# Altium footprint library DC-DC.PcbLib: 5 footprints
Each footprint in its own frame and in the unit in brackets; x right, y up, seen from the top. Pads: shape width x height; smd on the part's side, far side on the other; paste and mask are expansions set on the pad; w line width, h text height; cw(c..) or ccw(c..) is an arc to the next point about the centre after c.
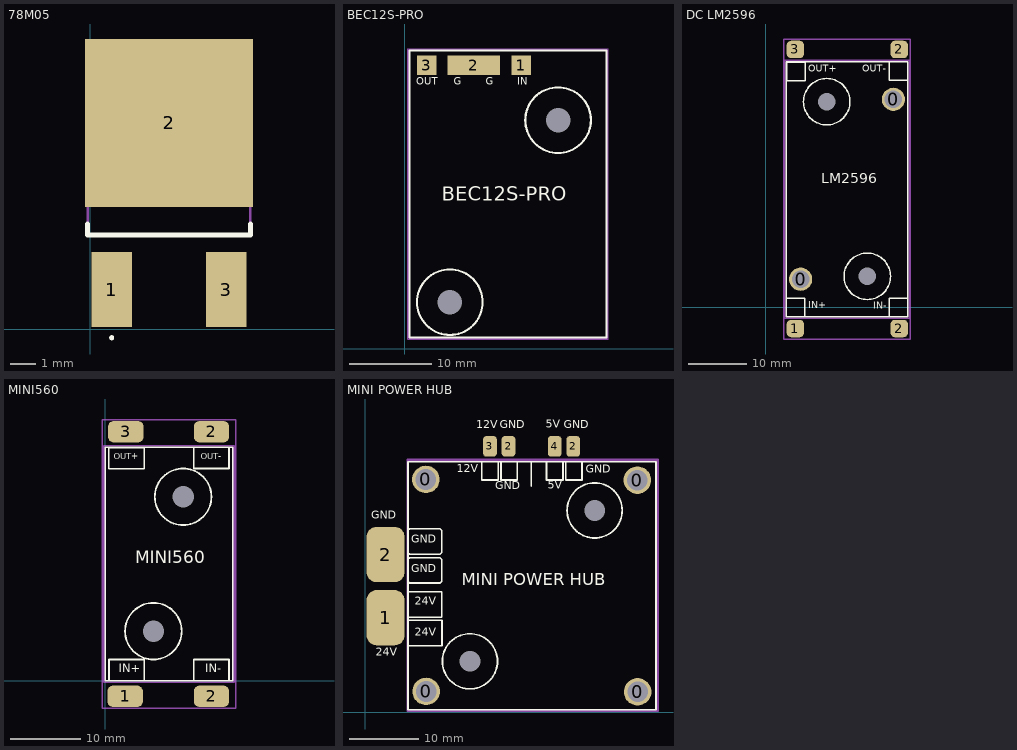
[diagram p0: the footprints below, top view; thin cyan lines are the x and y axes]

## 78M05 [mm]
pads (3):
  rect 1.6x3 smd: 1(0.86,1.579) 3(5.432,1.579)
  rect 6.7x6.7 smd: 2(3.146,8.229)
Top Overlay:
  lines w0.1: 0.86,-0.396 cw(c0.86,-0.346) 0.86,-0.296 cw(c0.86,-0.346) 0.86,-0.396
  lines w0.2: -0.104,4.204 -0.104,3.754 6.396,3.754 6.396,4.204
Mechanical 15:
  lines w0.1: -0.104,3.754 6.396,3.754 6.396,9.854 -0.104,9.854 -0.104,3.754
3D body "L78M05CDT.stp": height 2.39, standoff -0.13, extent -0.165,0.46 6.565,10.8

## BEC12S-PRO [mm]
pads (5):
  round 0 hole 3 unplated: 0(5.5,5.7) 0(18.707,27.9)
  rect 2.4x2.4 / inner rect 2.4x2.4 / far side rect 0x0 all layers, no hole: 1(14.2,34.6) 3(2.7,34.6)
  rect 6.4x2.4 / inner rect 2.4x2.4 / far side rect 0x0 all layers, no hole: 2(8.4,34.6)
Top Overlay:
  circle w0.254: c18.707,27.9 r4
  circle w0.254: c5.507,5.7 r4
  lines w0.254: 0.6,1.4 24.6,1.4 24.6,36.4 0.6,36.4 0.6,1.4
  text "OUT" at 1.4,31.917 h1.5
  text "IN" at 13.7,31.9 h1.5
  text "G" at 9.9,31.917 h1.5
  text "G" at 6,31.917 h1.5
  text "BEC12S-PRO" at 4.5,17.435 h3
Top Solder:
  region: 3.9,35.8 1.5,35.8 1.5,33.4 3.9,33.4
Mechanical 1:
  lines w0.1: 0.5,1.3 24.7,1.3 24.7,36.5 0.5,36.5 0.5,1.3
Top Courtyard:
  lines w0.1: 0.4,1.2 24.8,1.2 24.8,36.6 0.4,36.6 0.4,1.2
3D body "BEC12S-PRO.step": height 6.5, standoff -4.7, extent -0.1,-0.013 25.4,36.613

## DC LM2596 [mm]
pads (8):
  round 4 hole 3 mask+0.1: 0(6,4.8)
  round 0 hole 3 unplated: 0(10.5,35.4) 0(17.5,5.3)
  round 4 hole 3: 0(22,35.8)
  rrect50% 3x3 / inner rect 0x0 / far side rrect50% 0x0 all layers, no hole: 1(5.1,-3.7) 2(23,-3.7) 2(23,44.4) 3(5.1,44.4)
Top Overlay:
  circle w0.254: c10.5,35.4 r4
  circle w0.254: c17.5,5.3 r4
  lines w0.254: 3.5,-1.7 6.7,-1.7 6.7,1.5 3.5,1.5 3.5,-1.7 ; 3.5,-1.7 24.5,-1.7 ; 3.5,-1.7 3.5,42.3 24.5,42.3 ; 24.5,-1.7 21.3,-1.7 21.3,1.5 24.5,1.5 24.5,-1.7 ; 24.5,-1.7 24.5,42.3 ; 24.5,42.3 21.3,42.3 21.3,39.1 24.5,39.1 24.5,42.3 ; 3.6,39 6.8,39 6.8,42.2 3.6,42.2 3.6,39
  text "LM2596" at 9.6,20.735 h3
  text "IN+" at 7.3,-0.6 h2
  text "IN-" at 18.5,-0.7 h2
  text "OUT+" at 7.3,40.123 h2
  text "OUT-" at 16.6,40.123 h2
Mechanical 1:
  lines w0.254: 3.3,-1.9 24.7,-1.9 24.7,42.5 3.3,42.5 3.3,-1.9
Top Courtyard:
  lines w0.254: 3.1,-5.5 24.9,-5.5 24.9,46.2 3.1,46.2 3.1,-5.5
3D body "LM2596S.step": height 13.5, standoff 1, extent 3.5,-1.7 24.5,42.3

## MINI560 [mm]
pads (6):
  round 0 hole 3 unplated: 0(6.798,7.006) 0(11,26)
  rrect50% 5x3 / inner rect 0x0 / far side rrect50% 0x0 all layers, no hole: 1(2.8,-2.2) 2(15,-2.2) 2(15,35.2) 3(2.9,35.2)
Top Overlay:
  circle w0.254: c6.798,7.006 r4
  circle w0.254: c11,26 r4
  lines w0.254: 0,0 18,0 18,33 0,33 0,0 ; 0.498,29.951 5.498,29.951 5.498,32.951 0.498,32.951 0.498,29.951 ; 0.5,0 5.5,0 5.5,3 0.5,3 0.5,0 ; 12.5,0 17.5,0 17.5,3 12.5,3 12.5,0 ; 12.5,30 12.5,33 17.5,33 17.5,30 12.5,30
  text "MINI560" at 4.2,15.935 h3
  text "OUT-" at 13.5,30.917 h1.5
  text "OUT+" at 1.2,30.917 h1.5
  text "IN-" at 14.1,0.8 h2
  text "IN+" at 1.9,0.8 h2
Mechanical 1:
  lines w0.254: -0.2,-0.2 18.2,-0.2 18.2,33.2 -0.2,33.2 -0.2,-0.2
Top Courtyard:
  lines w0.2: -0.4,-3.9 18.4,-3.9 18.4,36.9 -0.4,36.9 -0.4,-3.9
3D body "MINI560.step": height 3, standoff -0.15, extent -0.316,-0.392 18.316,33.2

## MINI POWER HUB [mm]
pads (12):
  round 4 hole 3 mask+0.1: 0(8.8,33.8)
  round 4 hole 3: 0(8.85,3.025) 0(39.5,33.7) 0(39.55,2.975)
  round 0 hole 3 unplated: 0(15.2,7.4) 0(33.3,29.3)
  rrect50% 5.5x8 / inner rect 0x0 / far side rrect50% 0x0 all layers, no hole: 1(2.95,13.725) 2(2.95,22.9)
  rrect50% 2x3 / inner rect 0x0 / far side rrect50% 0x0 all layers, no hole: 2(20.8,38.6) 2(30.2,38.6) 3(18.1,38.6) 4(27.5,38.6)
Top Overlay:
  circle w0.254: c33.3,29.3 r4
  circle w0.254: c15.2,7.4 r4
  lines w0.254: 24.1,32.823 24.1,36.3 ; 6.205,13.787 6.205,17.487 11.105,17.487 11.105,13.787 6.205,13.787 ; 6.205,19.004 6.459,18.75 10.846,18.75 11.1,19.004 11.1,22.183 10.846,22.437 6.459,22.437 6.205,22.183 6.205,19.004 ; 6.205,23.191 6.459,22.937 10.851,22.937 11.105,23.191 11.105,26.383 10.851,26.637 6.459,26.637 6.205,26.383 6.205,23.191 ; 6.21,0.38 6.21,36.38 42.21,36.38 42.21,0.38 6.21,0.38 ; 6.232,9.642 6.232,13.342 11.132,13.342 11.132,9.642 6.232,9.642 ; 16.9,33.7 16.9,36.38 19.3,36.38 19.3,33.7 16.9,33.7 ; 19.7,33.7 19.7,36.38 22.06,36.38 22.06,33.7 19.7,33.7 ; 26.3,33.7 26.3,36.38 28.7,36.38 28.7,33.7 26.3,33.7 ; 29.1,33.7 29.1,36.38 31.46,36.38 31.46,33.7 29.1,33.7
  text "GND" at 28.8,40.823 h2
  text "5V" at 26.2,40.847 h2
  text "GND" at 19.5,40.823 h2
  text "24V" at 7.2,10.7 h2
  text "24V" at 7.2,15.2 h2
  text "GND" at 6.7,19.923 h2
  text "GND" at 6.7,24.173 h2
  text "5V" at 26.5,32.023 h2
  text "GND" at 32,34.323 h2
  text "12V" at 13.3,34.4 h2
  text "GND" at 18.9,31.923 h2
  text "12V" at 16.1,40.8 h2
  text "24V" at 1.5,7.8 h2
  text "GND" at 0.9,27.623 h2
  text "MINI POWER HUB" at 14,17.835 h3
Top Solder:
  region: 0.182,26.264 0.257,26.446 0.367,26.61 0.506,26.749 0.67,26.858 0.852,26.934 1.023,26.968 1.143,26.972 4.742,26.972 4.935,26.934 5.117,26.858 5.281,26.749 5.42,26.61 5.53,26.446 5.605,26.264 5.638,26.097 5.643,25.972 5.643,19.972 5.643,19.874 5.605,19.68 5.53,19.498 5.42,19.335 5.281,19.195 5.117,19.086 4.935,19.011 4.742,18.972 4.643,18.972 1.045,18.972 0.852,19.011 0.67,19.086 0.506,19.195 0.367,19.335 0.257,19.498 0.182,19.68 0.143,19.874 0.143,19.972 0.143,25.972 0.143,26.071
  region: 0.246,17.075 0.321,17.257 0.431,17.421 0.57,17.56 0.734,17.669 0.916,17.745 1.087,17.779 1.207,17.783 4.806,17.783 4.999,17.745 5.181,17.669 5.345,17.56 5.484,17.421 5.594,17.257 5.669,17.075 5.702,16.908 5.707,16.783 5.707,10.783 5.707,10.685 5.669,10.491 5.594,10.309 5.484,10.146 5.345,10.006 5.181,9.897 4.999,9.821 4.806,9.783 4.707,9.783 1.109,9.783 0.916,9.821 0.734,9.897 0.57,10.006 0.431,10.146 0.321,10.309 0.246,10.491 0.207,10.685 0.207,10.783 0.207,16.783 0.207,16.882
Mechanical 1:
  lines w0.254: 6.1,0.2 42.4,0.2 42.4,36.5 6.1,36.5 6.1,0.2
Top Courtyard:
  lines w0.254: 6.1,0.2 42.5,0.2 42.5,36.7 6.1,36.7 6.1,0.2
3D body "Matek Power Hub.step": height 3.76, standoff 0, extent 6.05,0.25 42.3,36.5